# Altium footprint library ALL.PcbLib: 385 footprints (part 7 of 25)
Each footprint in its own frame and in the unit in brackets; x right, y up, seen from the top. Pads: shape width x height; smd on the part's side, far side on the other; paste and mask are expansions set on the pad; w line width, h text height; cw(c..) or ccw(c..) is an arc to the next point about the centre after c.
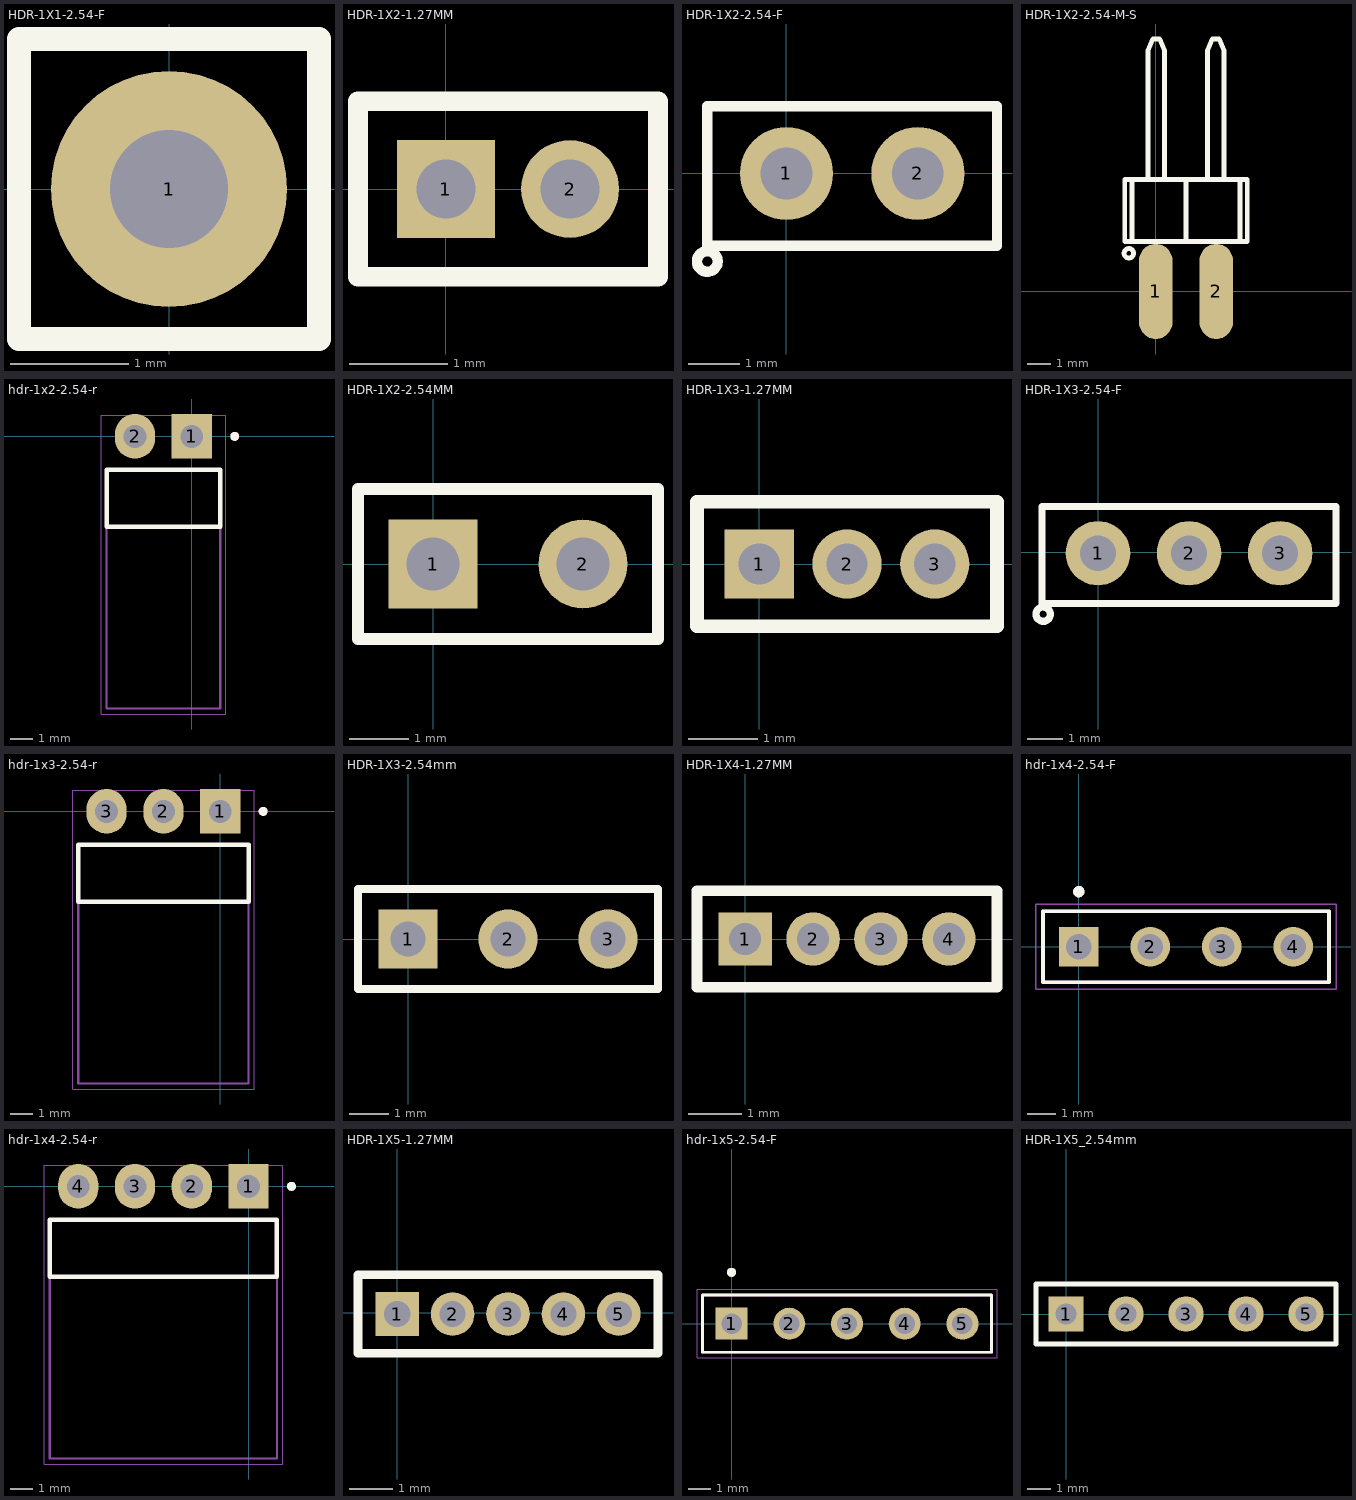
[diagram p6: the footprints below, top view; thin cyan lines are the x and y axes]

## HDR-1X1-2.54-F [mm]
pads (1):
  round 2 hole 1: 1(0,0)
Top Overlay:
  lines w0.2: -1.27,-1.27 -1.27,1.27 1.27,1.27 1.27,-1.27 -1.27,-1.27
3D body "PBS-1.stp": height 8.5, standoff -3.15, extent -1.27,-1.27 1.27,1.27

## HDR-1X2-1.27MM [mm]
pads (2):
  rect 1x1 hole 0.6: 1(0,0)
  round 1 hole 0.6: 2(1.27,0)
Top Overlay:
  lines w0.2: -0.9,-0.9 2.17,-0.9 2.17,0.9 -0.9,0.9 -0.9,-0.9
3D body "User Library-PIN-Header-1_27_1x2.STEP": height 4.85, standoff -2.4, extent -0.66,-1.245 1.88,1.155

## HDR-1X2-2.54-F [mm]
pads (2):
  round 1.8 hole 1 mask+0.1: 1(0,0) 2(2.54,0)
Top Overlay:
  circle w0.2: c-1.53,-1.7 r0.2
  lines w0.2: -1.53,-1.4 -1.53,1.3 4.07,1.3 4.07,-1.4 -1.53,-1.4
3D body "female_header_a-bl254-eg-g02d.stp": height 8.5, standoff -3.2, extent -1.395,-1.3 3.935,1.2

## HDR-1X2-2.54-M-S [mm]
pads (2):
  oval 1.4x4 smd mask+0.1: 1(0,0) 2(2.54,0)
Top Overlay:
  circle w0.2: c-1.13,1.6 r0.2
  lines w0.2: -1,2.1 -1,4.7 ; -0.33,4.7 -0.33,10.1 -0.13,10.6 0.17,10.6 0.37,10.1 ; 0.37,4.7 0.37,10.1 ; 1.27,2.1 1.27,4.7 ; 2.17,4.7 2.17,10.1 ; 2.87,4.7 2.87,10.1 2.67,10.6 2.37,10.6 2.17,10.1 ; 3.54,2.1 3.54,4.7 ; 0.37,10.1 0.37,10.1 ; 2.17,10.1 2.17,10.1 ; -1.3,2.1 -1.3,4.7 3.84,4.7 3.84,2.1 -1.3,2.1
3D body "pin_header_aw140-eg-g02a.stp": height 1.55, standoff -0.95, extent -1.27,-1.78 3.71,10.62

## hdr-1x2-2.54-r [mm]
pads (2):
  rect 1.8x2 hole 1.02: 1(0,0)
  oval 1.8x2 hole 1.02: 2(-2.54,0)
Top Overlay:
  circle w0.2: c1.92,0 r0.1
  lines w0.2: -3.81,-4.04 1.27,-4.04 1.27,-1.5 -3.81,-1.5 -3.81,-4.04
Mechanical 13:
  circle w0.2: c1.92,0 r0.1
  lines w0.1: -3.81,-4.04 -3.81,-12.17 1.27,-12.17 1.27,-4.04 ; -3.81,-4.04 1.27,-4.04 ; -3.81,-4.04 -3.81,-1.5 1.27,-1.5 1.27,-4.04
Mechanical 15:
  lines w0.05: -4.06,-12.42 1.52,-12.42 1.52,0.935 -4.06,0.935 -4.06,-12.42
3D body "TSW-102-16-G-S-RA.stp": height 3.27, standoff -4.83, extent -3.81,-12.065 1.27,0.445

## HDR-1X2-2.54MM [mm]
pads (2):
  rect 1.5x1.5 hole 0.9: 1(0,0)
  round 1.5 hole 0.9: 2(2.54,0)
Top Overlay:
  lines w0.2: -1.27,-1.27 3.81,-1.27 3.81,1.27 -1.27,1.27 -1.27,-1.27
3D body "User Library-1x2 TH Pitch 2_54mm.STEP": height 9.5, standoff -3.2, extent -1.372,-1.168 3.708,1.372

## HDR-1X3-1.27MM [mm]
pads (3):
  rect 1x1 hole 0.6: 1(0,0)
  round 1 hole 0.6: 2(1.27,0) 3(2.54,0)
Top Overlay:
  lines w0.2: -0.9,-0.9 -0.9,0.9 3.44,0.9 3.44,-0.9 -0.9,-0.9
3D body "User Library-PIN-Header-1_27_1x3.STEP": height 4.85, standoff -2.4, extent -0.686,-1.232 3.124,1.168

## HDR-1X3-2.54-F [mm]
pads (3):
  round 1.8 hole 1 mask+0.1: 1(0,-0.025) 2(2.54,-0.025) 3(5.08,-0.025)
Top Overlay:
  circle w0.2: c-1.53,-1.725 r0.2
  lines w0.2: -1.56,-1.425 -1.56,1.275 6.64,1.275 6.64,-1.425 -1.56,-1.425
3D body "female_header_a-bl254-eg-g03d.stp": height 8.5, standoff -3.2, extent -1.395,-1.325 6.475,1.175

## hdr-1x3-2.54-r [mm]
pads (3):
  rect 1.8x2 hole 1.02: 1(0,0)
  oval 1.8x2 hole 1.02: 2(-2.54,0) 3(-5.08,0)
Top Overlay:
  circle w0.2: c1.92,0 r0.1
  lines w0.2: -6.35,-4.04 1.27,-4.04 1.27,-1.5 -6.35,-1.5 -6.35,-4.04
Mechanical 13:
  circle w0.2: c1.92,0 r0.1
  lines w0.1: -6.35,-4.04 -6.35,-12.17 1.27,-12.17 1.27,-4.04 ; -6.35,-4.04 1.27,-4.04 ; -6.35,-4.04 -6.35,-1.5 1.27,-1.5 1.27,-4.04
Mechanical 15:
  lines w0.05: -6.6,-12.42 1.52,-12.42 1.52,0.935 -6.6,0.935 -6.6,-12.42
3D body "TSW-103-16-G-S-RA.stp": height 3.07, standoff -5.03, extent -6.35,-12.065 1.27,0.444

## HDR-1X3-2.54mm [mm]
pads (3):
  rect 1.5x1.5 hole 0.9: 1(0,0)
  round 1.5 hole 0.9: 2(2.54,0) 3(5.08,0)
Top Overlay:
  lines w0.2: -1.27,-1.27 -1.27,1.27 6.35,1.27 6.35,-1.27 -1.27,-1.27
3D body "User Library-PLS3.STEP": height 8.54, standoff -3, extent -1.397,-1.27 6.223,1.27

## HDR-1X4-1.27MM [mm]
pads (4):
  rect 1x1 hole 0.6: 1(0,0)
  round 1 hole 0.6: 2(1.27,0) 3(2.54,0) 4(3.81,0)
Top Overlay:
  lines w0.2: -0.9,-0.9 -0.9,0.9 4.71,0.9 4.71,-0.9 -0.9,-0.9
3D body "TMS-104-52-S-S.stp": height 7.75, standoff -3.05, extent -0.661,-1.194 4.419,1.245

## hdr-1x4-2.54-F [mm]
pads (4):
  rect 1.408x1.408 hole 0.9: 1(0,0)
  round 1.408 hole 0.9: 2(2.54,0) 3(5.08,0) 4(7.62,0)
Top Overlay:
  circle w0.2: c0,1.955 r0.1
  lines w0.127: -1.27,-1.26 -1.27,1.26 8.89,1.26 8.89,-1.26 -1.27,-1.26
Mechanical 13:
  circle w0.2: c0,1.955 r0.1
  lines w0.127: -1.27,-1.26 -1.27,1.26 8.89,1.26 8.89,-1.26 -1.27,-1.26
Mechanical 15:
  lines w0.05: -1.52,-1.51 -1.52,1.51 9.14,1.51 9.14,-1.51 -1.52,-1.51
3D body "215297-4--3DModel-STEP-1.STEP": height 6.98, standoff -3.02, extent -1.27,-1.26 8.89,1.26

## hdr-1x4-2.54-r [mm]
pads (4):
  rect 1.8x2 hole 1.02: 1(0,0)
  oval 1.8x2 hole 1.02: 2(-2.54,0) 3(-5.08,0) 4(-7.62,0)
Top Overlay:
  circle w0.2: c1.92,0 r0.1
  lines w0.2: -8.89,-4.04 -8.89,-1.5 1.27,-1.5 1.27,-4.04 -8.89,-4.04
Mechanical 13:
  circle w0.2: c1.92,0 r0.1
  lines w0.1: -8.89,-4.04 -8.89,-1.5 1.27,-1.5 1.27,-4.04 ; -8.89,-4.04 1.27,-4.04 ; -8.89,-4.04 -8.89,-12.17 1.27,-12.17 1.27,-4.04
Mechanical 15:
  lines w0.05: -9.14,-12.42 -9.14,0.935 1.52,0.935 1.52,-12.42 -9.14,-12.42
3D body "TSW-104-16-G-S-RA.stp": height 3.07, standoff -5.03, extent -8.89,-12.128 1.27,0.381

## HDR-1X5-1.27MM [mm]
pads (5):
  rect 1x1 hole 0.6: 1(0,-0.025)
  round 1 hole 0.6: 2(1.27,-0.025) 3(2.54,-0.025) 4(3.81,-0.025) 5(5.08,-0.025)
Top Overlay:
  lines w0.2: -0.9,-0.925 5.98,-0.925 5.98,0.875 -0.9,0.875 -0.9,-0.925
3D body "TMS-105-52-S-S.stp": height 7.75, standoff -3.05, extent -0.635,-1.245 5.715,1.194

## hdr-1x5-2.54-F [mm]
pads (5):
  rect 1.408x1.408 hole 0.9: 1(0,0)
  round 1.408 hole 0.9: 2(2.54,0) 3(5.08,0) 4(7.62,0) 5(10.16,0)
Top Overlay:
  circle w0.2: c0,2.26 r0.1
  lines w0.127: -1.27,-1.26 -1.27,1.26 11.43,1.26 11.43,-1.26 -1.27,-1.26
Mechanical 13:
  circle w0.2: c0,2.26 r0.1
  lines w0.127: -1.27,-1.26 -1.27,1.26 11.43,1.26 11.43,-1.26 -1.27,-1.26
Mechanical 15:
  lines w0.05: -1.52,-1.51 -1.52,1.51 11.68,1.51 11.68,-1.51 -1.52,-1.51
3D body "step_temp.STEP": height 7.11, standoff -2.89, extent -0.991,-1.26 11.709,1.26

## HDR-1X5_2.54mm [mm]
pads (5):
  rect 1.5x1.5 hole 0.9: 1(0,0)
  round 1.5 hole 0.9: 2(2.54,0) 3(5.08,0) 4(7.62,0) 5(10.16,0)
Top Overlay:
  lines w0.2: -1.27,-1.27 -1.27,1.27 11.43,1.27 11.43,-1.27 -1.27,-1.27
3D body "User Library-PLS-5.STEP": height 8.54, standoff -3, extent -1.27,-1.397 11.43,1.143